# Altium footprint library 20210518.PcbLib: 414 footprints (part 1 of 26)
Each footprint in its own frame and in the unit in brackets; x right, y up, seen from the top. Pads: shape width x height; smd on the part's side, far side on the other; paste and mask are expansions set on the pad; w line width, h text height; cw(c..) or ccw(c..) is an arc to the next point about the centre after c.
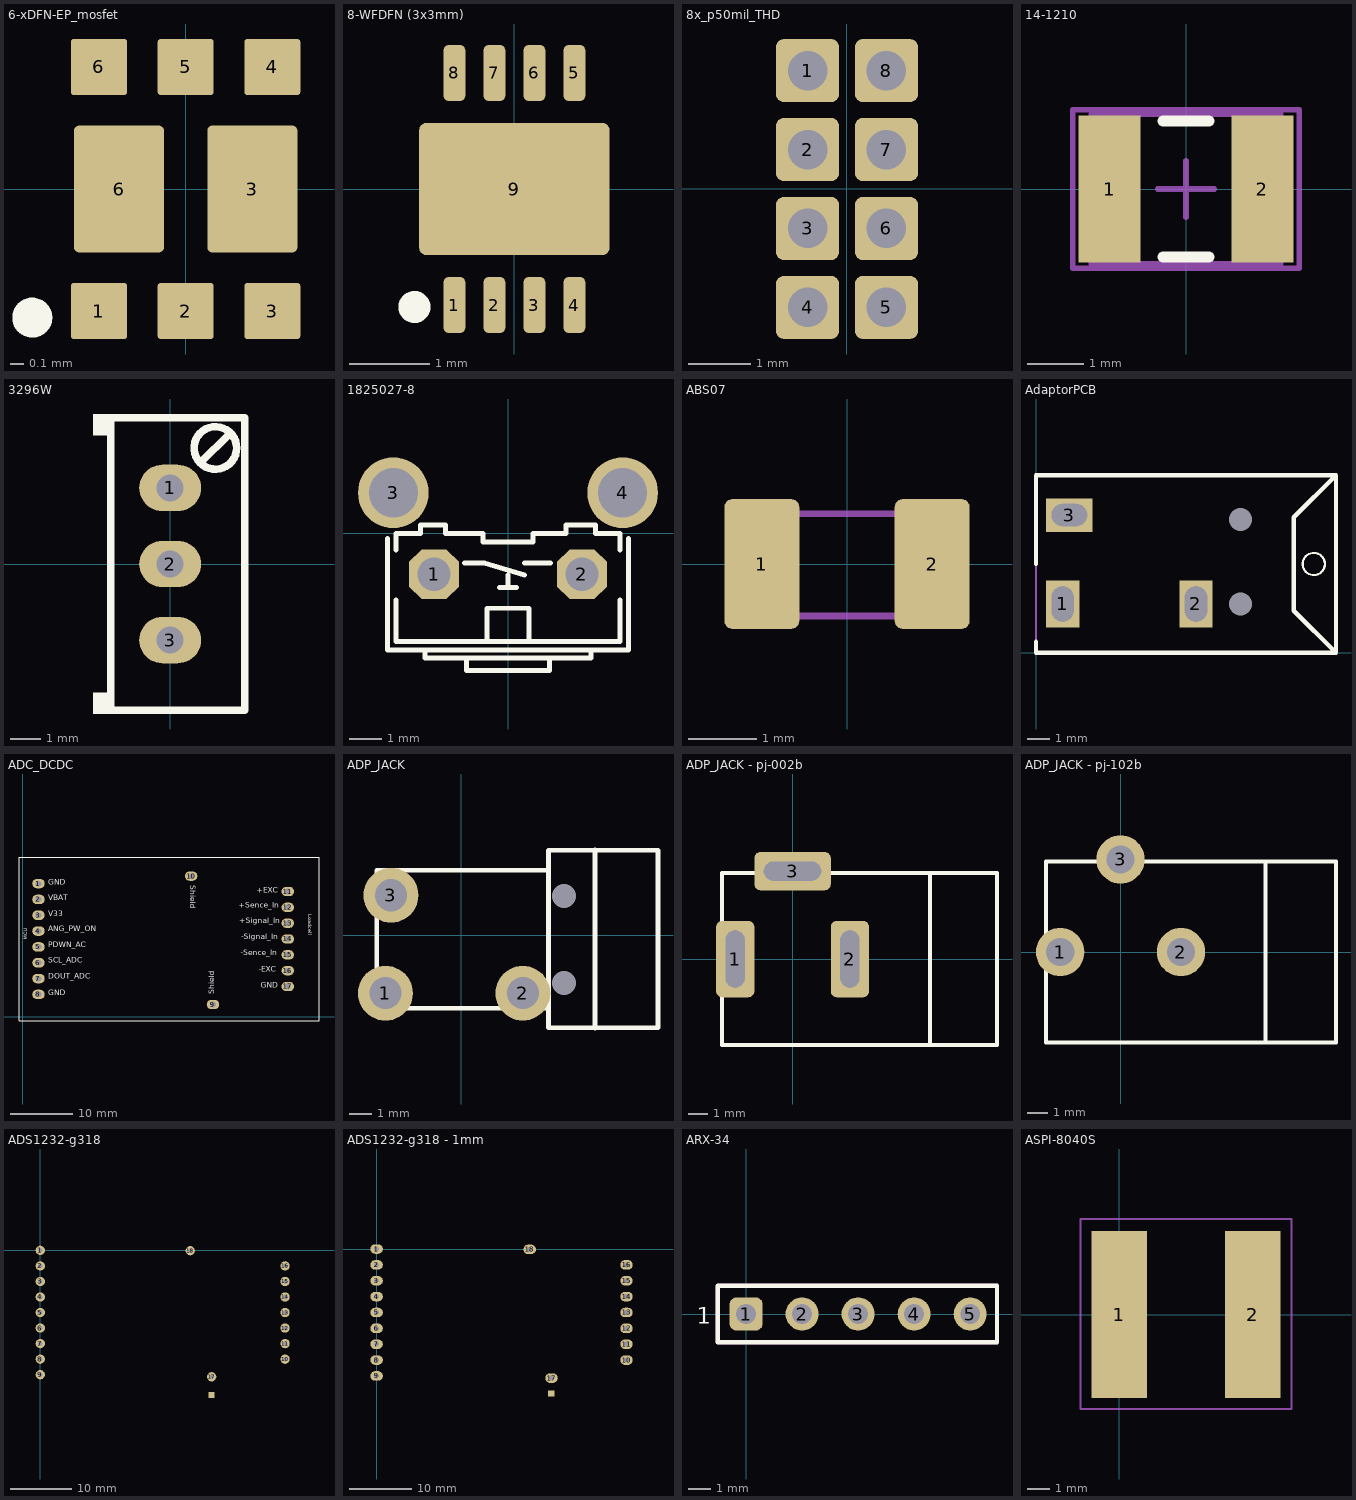
[diagram p0: the footprints below, top view; thin cyan lines are the x and y axes]

## 6-xDFN-EP_mosfet [mm]
height 0.9
pads (8):
  rrect10% 0.42x0.42 smd mask+0.076: 1(-0.65,-0.915) 2(0,-0.915) 3(0.65,-0.915) 4(0.65,0.915) 5(0,0.915) 6(-0.65,0.915)
  rrect10% 0.675x0.95 smd mask+0.076: 3(0.5,0) 6(-0.5,0)
Top Overlay:
  circle w0.15: c-1.15,-0.965 r0.075
3D body: height 0.8, standoff 0, extent -1,-1 1,1

## 8-WFDFN (3x3mm) [mm]
height 0.9
pads (9):
  rrect50% 0.275x0.7 smd mask+0.076: 1(-0.75,-1.45) 2(-0.25,-1.45) 3(0.25,-1.45) 4(0.75,-1.45) 5(0.75,1.45) 6(0.25,1.45) 7(-0.25,1.45) 8(-0.75,1.45)
  rrect10% 2.38x1.65 smd mask+0.076: 9(0,0)
Top Overlay:
  circle w0.2: c-1.25,-1.475 r0.1
Top Solder:
  rectangle: -0.975,1.025 0.975,1.875
  rectangle: -0.975,-1.875 0.975,-1.025
3D body: height 0.8, standoff 0, extent -1.5,-1.51 1.5,1.51

## 8x_p50mil_THD [mil]
pads (8):
  rrect25% 40x40 hole 25 mask+0: 1(-25,75) 2(-25,25) 3(-25,-25) 4(-25,-75) 5(25,-75) 6(25,-25) 7(25,25) 8(25,75)

## 14-1210 [mm] "Chip Resistor, Body 3.2x2.5mm, IPC High Density"
height 0.9
pads (2):
  rect 1.1x2.6 smd: 1(-1.35,0) 2(1.35,0)
Top Overlay:
  lines w0.2: -0.4,-1.2 0.4,-1.2 ; -0.4,1.2 0.4,1.2
Mechanical 13:
  lines w0.1: -1.675,-1.32 1.675,-1.32 1.675,1.32 -1.675,1.32 -1.675,-1.32
Mechanical 15:
  lines w0.1: -0.5,0 0.5,0 ; 0,-0.5 0,0.5 ; -2,-1.4 2,-1.4 2,1.4 -2,1.4 -2,-1.4
3D body: height 0.9, standoff 0, extent -1.675,-1.32 1.675,1.32

## 3296W [mil]
height 400
pads (3):
  oval 80x60 hole 35 mask+0: 1(0,98.43) 2(0,0) 3(0,-98.43)
Top Overlay:
  circle w10: c58.53,150 r27.47
  rectangle: -99.41,-193.9 -76.77,-166.34
  rectangle: -99.41,166.34 -76.77,193.9
  lines w10: -94.49,-188.98 96.46,-188.98 96.46,188.98 -94.49,188.98 ; -76.77,-188.98 -76.77,188.98 ; 40,132 76,167
3D body: height 455.12, standoff -251.57, extent -94.68,-187.6 95.52,187.6

## 1825027-8 [mil] "B3F-31XX"
pads (4):
  oct 60x60 hole 40: 1(-89,-49.02) 2(89,-49.02)
  round 85 hole 59: 3(-138,49) 4(138,49)
Top Overlay:
  lines w6: -145,-5.91 -145,-140 100,-140 ; -135,-80 -135,-130 -25,-130 ; -135,-20 -135,0 -105,0 -105,10 -75,10 -75,0 -30,0 -30,-10 30,-10 30,0 70,0 70,10 105,10 105,0 135,0 135,-20 ; -100,-140 -100,-150 -50,-150 ; -52.17,-35.43 -28.54,-35.43 20,-50 ; -10,-65 0,-65 ; 0,-50 0,-65 ; 10,-65 0,-65 ; 19.68,-35.43 51.18,-35.43 ; 135,-80 135,-130 25,-130 ; 145,-5.91 145,-140 100,-140 ; -50,-150 50,-150 ; -50,-150 -50,-165 50,-165 50,-150 ; -25,-130 25,-130 ; -25,-130 -25,-90 25,-90 25,-130 ; 50,-150 100,-150 100,-140
3D body: height 314.85, standoff -99.15, extent -161.56,-278.59 169.44,108.91

## ABS07 [mm] "32.768kHz SMD LOW PROFILE CRYSTAL, 3.20mm*1.50mm"
height 4.3
pads (2):
  rrect20% 1.1x1.9 smd: 1(-1.25,0) 2(1.25,0)
Mechanical 15:
  lines w0.1: -1.499,-0.762 1.549,-0.762 ; -1.499,0.737 1.549,0.737
3D body: height 0.91, standoff 0, extent -1.61,-0.76 1.61,0.76

## AdaptorPCB [mm] "THD, 3-Leads"
height 9
pads (5):
  rect 1.5x2.1 hole 1 slot 1.6 at 90 deg: 1(1.2,2.2) 2(7.2,2.2)
  rect 2.1x1.5 hole 1 slot 1.6 at 0 deg: 3(1.5,6.2)
  round 0 hole 1.05: 4(9.2,6) 5(9.2,2.2)
Top Overlay:
  circle w0.1: c12.5,4 r0.5
  lines w0.2: 0,0.5 0,0 13.5,0 ; 0,4 0,8 13.5,8 ; 13.5,0 11.6,1.9 11.6,6.1 13.5,8 ; 13.5,0 13.5,8
Mechanical 13:
  lines w0.1: 0,0 0,8 13.5,8 13.5,0 0,0
Mechanical 15:
  lines w0.05: 0,0 0,8 13.5,8 13.5,0 0,0

## ADC_DCDC [mm] "ADC_DCDC Modulü Oval"
pads (17):
  oval 2x1.5 hole 0.9: 1(2.5,21.4) 2(2.5,18.86) 3(2.5,16.32) 4(2.5,13.78) 5(2.5,11.24) 6(2.5,8.7) 7(2.5,6.16) 8(2.5,3.62) 9(30.5,2) 10(27,22.6) 11(42.5,20.13) 12(42.5,17.59) 13(42.5,15.05) 14(42.5,12.51) 15(42.5,9.97) 16(42.5,7.43) 17(42.5,4.89)
Top Overlay:
  lines w0.1: -0.62,-0.571 47.513,-0.571 47.513,25.591 -0.62,25.591 -0.62,-0.571
  text "MCU" at 0.92,12.36 h1
  text "Loadcell" at 45.57,16.48 h1
  text "+EXC" at 37.541,19.642 h1.52
  text "+Sence_In" at 34.624,17.229 h1.52
  text "+Signal_In" at 34.7,14.697 h1.52
  text "-Signal_In" at 35.012,12.157 h1.52
  text "-Sence_In" at 34.936,9.609 h1.52
  text "-EXC" at 37.853,6.942 h1.52
  text "GND" at 38.131,4.402 h1.52
  text "Shield" at 30.988,3.62 h1.52
  text "Shield" at 26.512,21.15 h1.52
  text "GND" at 4.069,20.912 h1.52
  text "VBAT" at 4.07,18.372 h1.52
  text "V33" at 4.07,15.838 h1.52
  text "ANG_PW_ON" at 4.069,13.419 h1.52
  text "PDWN_AC" at 4.069,10.879 h1.52
  text "SCL_ADC" at 4.069,8.339 h1.52
  text "DOUT_ADC" at 4.069,5.799 h1.52
  text "GND" at 4.069,3.132 h1.52
3D body: height 6.4, standoff -6.29, extent -0.001,-0.001 47.021,25.021

## ADP_JACK [mm] "Standart Kullanýlan Adaptor Konnektörü 3 Pin"
pads (5):
  round 2.399 hole 1.4: 1(-3.308,-2.541) 2(2.692,-2.541) 3(-3.068,1.737)
  round 0 hole 1.05: 4(4.492,1.71) 5(4.492,-2.09)
Top Overlay:
  lines w0.203: 3.815,-4.003 3.815,3.708 ; 5.842,-4.064 5.842,3.719 ; -3.688,-3.19 -3.688,2.824 3.81,2.824 3.81,3.708 8.595,3.708 8.595,-4.044 3.81,-4.044 3.81,-3.19 -3.688,-3.19
3D body: height 11.5, standoff -3, extent -3.7,-6.7 10.7,2.7

## ADP_JACK - pj-002b [mm] "5.5mm Adaptor Konnektörü 3 Pin"
pads (3):
  rrect30% 2x4 hole 1 slot 3 at 90 deg: 1(-3,0) 2(3,0)
  rrect30% 4x2 hole 1 slot 3 at 0 deg: 3(0,4.6)
Top Overlay:
  lines w0.203: 7.2,-4.5 7.2,4.5 ; -3.7,-4.5 -3.7,4.5 10.7,4.5 10.7,-4.5 -3.7,-4.5
3D body: height 11, standoff -3.5, extent -3.7,-4.6 10.7,4.8

## ADP_JACK - pj-102b [mm] "5.5mm Adaptor Konnektörü 3 Pin"
pads (3):
  round 2.399 hole 1.4: 1(-3,0) 2(3,0) 3(0,4.6)
Top Overlay:
  lines w0.203: 7.2,-4.5 7.2,4.5 ; -3.7,-4.5 -3.7,4.5 10.7,4.5 10.7,-4.5 -3.7,-4.5
3D body: height 11, standoff -3.5, extent -3.7,-4.6 10.7,4.8

## ADS1232-g318 [mil] "TEM Terazi ADC Modülü"
pads (19):
  round 60 hole 30: 1(0,0) 2(0,-100) 3(0,-200) 4(0,-300) 5(0,-400) 6(0,-500) 7(0,-600) 8(0,-700) 9(0,-800) 10(1574.8,-700) 11(1574.8,-600) 12(1574.8,-500) 13(1574.8,-400) 14(1574.8,-300) 15(1574.8,-200) 16(1574.8,-100) 17(1102.36,-813.39) 18(964.57,-2.36)
  rect 39.37x39.37 smd: 17(1100.36,-930.39)
Top Solder:
  lines w78.74: -137,-932 1793,-932 1793,131 -137,131 -137,-932
3D body: height 232.34, standoff -267.49, extent -98.01,-892.99 1753.12,91.99

## ADS1232-g318 - 1mm [mm] "TEM Terazi ADC Modülü"
pads (19):
  oval 2x1.524 hole 0.8: 1(0,0) 2(0,-2.54) 3(0,-5.08) 4(0,-7.62) 5(0,-10.16) 6(0,-12.7) 7(0,-15.24) 8(0,-17.78) 9(0,-20.32) 10(40,-17.78) 11(40,-15.24) 12(40,-12.7) 13(40,-10.16) 14(40,-7.62) 15(40,-5.08) 16(40,-2.54) 17(28,-20.66) 18(24.5,-0.06)
  rect 1x1 smd: 17(27.949,-23.132)
Top Solder:
  lines w1: -2.98,-23.173 45.042,-23.173 45.042,2.827 -2.98,2.827 -2.98,-23.173
3D body: height 5.9, standoff -6.79, extent -2.489,-22.682 44.529,2.337

## ARX-34 [mm] "Udea ARX-34, 0.54mm"
pads (5):
  rrect40% 1.5x1.5 hole 0.9: 1(0,0)
  round 1.5 hole 0.9: 2(2.54,0) 3(5.08,0) 4(7.62,0) 5(10.16,0)
Top Overlay:
  lines w0.2: -1.275,-1.275 11.375,-1.275 11.375,1.275 -1.275,1.275 -1.275,-1.275
  text "1" at -2.225,-0.7 h1.27
Mechanical 13:
  lines w0.2: -1.275,-1.275 -1.275,1.275 11.375,1.275 11.375,-1.275 -1.275,-1.275
Mechanical 15:
  lines w0.2: -1.275,-1.275 11.375,-1.275 11.375,1.275 -1.275,1.275 -1.275,-1.275
3D body: height 14.5, standoff -1.5, extent -0.9,-3.35 39.1,0.9

## ASPI-8040S [mm] "Abracon LLC - ASPI-8040S"
height 4
pads (2):
  rect 2.5x7.5 smd: 1(0,0) 2(6,0)
Mechanical 15:
  lines w0.1: -1.75,-4.25 7.75,-4.25 7.75,4.3 -1.75,4.3 -1.75,-4.25
3D body: height 2.64, standoff 0, extent -1,-4 7,4